# Altium footprint library PcbLib_ICs.PcbLib: 317 footprints (part 10 of 24)
Each footprint in its own frame and in the unit in brackets; x right, y up, seen from the top. Pads: shape width x height; smd on the part's side, far side on the other; paste and mask are expansions set on the pad; w line width, h text height; cw(c..) or ccw(c..) is an arc to the next point about the centre after c.
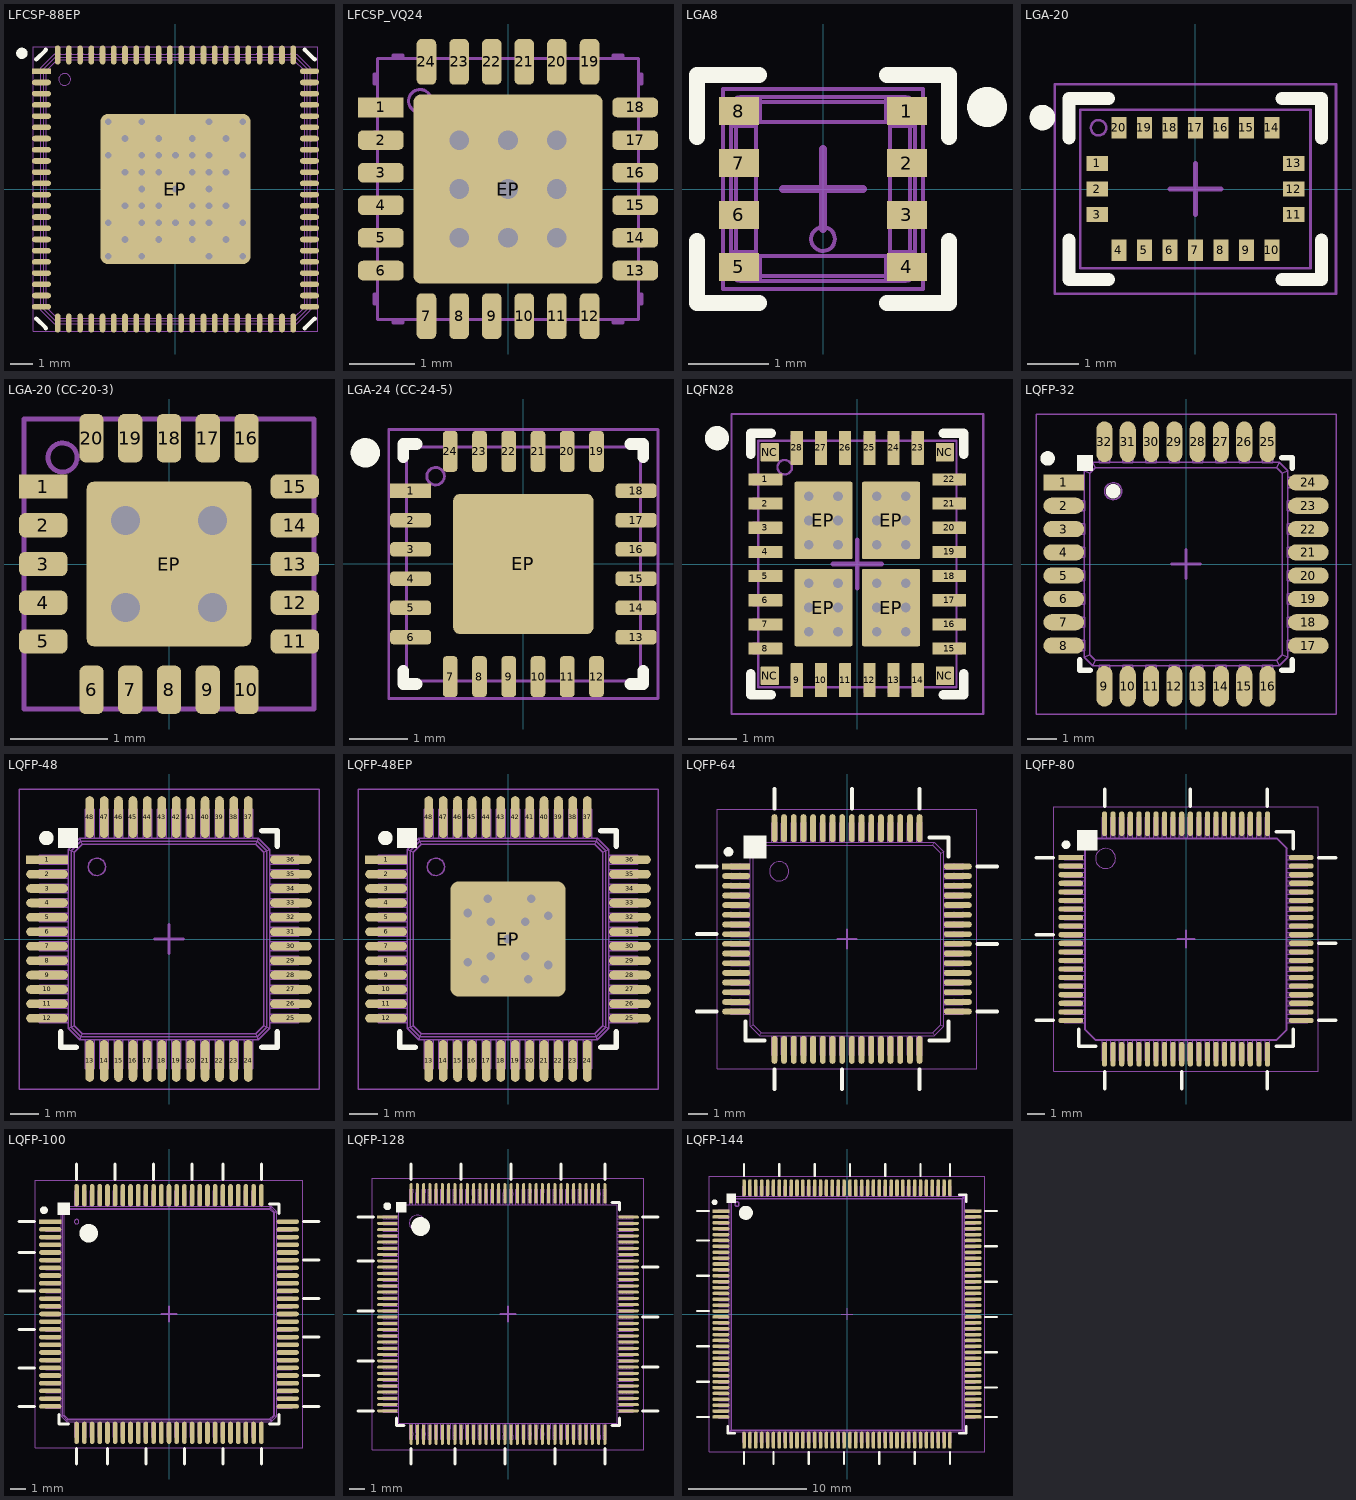
[diagram p9: the footprints below, top view; thin cyan lines are the x and y axes]

## LFCSP-88EP [mm]
pads (89):
  rect 0.85x0.25 smd paste+0 mask+0.08: 1(-5.975,5.25)
  oval 0.85x0.25 smd paste+0 mask+0.08: 2(-5.975,4.75) 3(-5.975,4.25) 4(-5.975,3.75) 5(-5.975,3.25) 6(-5.975,2.75) 7(-5.975,2.25) 8(-5.975,1.75) 9(-5.975,1.25) 10(-5.975,0.75) 11(-5.975,0.25) 12(-5.975,-0.25) 13(-5.975,-0.75) 14(-5.975,-1.25) 15(-5.975,-1.75) 16(-5.975,-2.25) 17(-5.975,-2.75) 18(-5.975,-3.25) 19(-5.975,-3.75) 20(-5.975,-4.25) 21(-5.975,-4.75) 22(-5.975,-5.25) 45(5.975,-5.25) 46(5.975,-4.75) 47(5.975,-4.25) 48(5.975,-3.75) 49(5.975,-3.25) 50(5.975,-2.75) 51(5.975,-2.25) 52(5.975,-1.75) 53(5.975,-1.25) 54(5.975,-0.75) 55(5.975,-0.25) 56(5.975,0.25) 57(5.975,0.75) 58(5.975,1.25) 59(5.975,1.75) 60(5.975,2.25) 61(5.975,2.75) 62(5.975,3.25) 63(5.975,3.75) 64(5.975,4.25) 65(5.975,4.75) 66(5.975,5.25)
  oval 0.25x0.85 smd paste+0 mask+0.08: 23(-5.25,-5.975) 24(-4.75,-5.975) 25(-4.25,-5.975) 26(-3.75,-5.975) 27(-3.25,-5.975) 28(-2.75,-5.975) 29(-2.25,-5.975) 30(-1.75,-5.975) 31(-1.25,-5.975) 32(-0.75,-5.975) 33(-0.25,-5.975) 34(0.25,-5.975) 35(0.75,-5.975) 36(1.25,-5.975) 37(1.75,-5.975) 38(2.25,-5.975) 39(2.75,-5.975) 40(3.25,-5.975) 41(3.75,-5.975) 42(4.25,-5.975) 43(4.75,-5.975) 44(5.25,-5.975) 67(5.25,5.975) 68(4.75,5.975) 69(4.25,5.975) 70(3.75,5.975) 71(3.25,5.975) 72(2.75,5.975) 73(2.25,5.975) 74(1.75,5.975) 75(1.25,5.975) 76(0.75,5.975) 77(0.25,5.975) 78(-0.25,5.975) 79(-0.75,5.975) 80(-1.25,5.975) 81(-1.75,5.975) 82(-2.25,5.975) 83(-2.75,5.975) 84(-3.25,5.975) 85(-3.75,5.975) 86(-4.25,5.975) 87(-4.75,5.975) 88(-5.25,5.975)
  rrect10% 6.7x6.7 smd paste-10 mask+0.08: EP(0,0)
via -3,-1.5 diameter 0.7 hole 0.3
via -3,-3 diameter 0.7 hole 0.3
via -1.5,-3 diameter 0.7 hole 0.3
via 1.5,-3 diameter 0.7 hole 0.3
via 3,-3 diameter 0.7 hole 0.3
via 3,-1.5 diameter 0.7 hole 0.3
via 3,1.5 diameter 0.7 hole 0.3
via 3,3 diameter 0.7 hole 0.3
via 1.5,3 diameter 0.7 hole 0.3
via -3,3 diameter 0.7 hole 0.3
via -3,1.5 diameter 0.7 hole 0.3
via -1.5,3 diameter 0.7 hole 0.3
via -1.5,0.75 diameter 0.7 hole 0.3
via -1.5,-0.75 diameter 0.7 hole 0.3
via -2.25,0.75 diameter 0.7 hole 0.3
via -0.75,2.25 diameter 0.7 hole 0.3
via -2.25,2.25 diameter 0.7 hole 0.3
via -2.25,-0.75 diameter 0.7 hole 0.3
via -0.75,-2.25 diameter 0.7 hole 0.3
via -2.25,-2.25 diameter 0.7 hole 0.3
via -1.5,-1.5 diameter 0.7 hole 0.3
via -0.75,-0.75 diameter 0.7 hole 0.3
via 0.75,-2.25 diameter 0.7 hole 0.3
via 2.25,-0.75 diameter 0.7 hole 0.3
via 2.25,-2.25 diameter 0.7 hole 0.3
via 1.5,-1.5 diameter 0.7 hole 0.3
via 0.75,-0.75 diameter 0.7 hole 0.3
via 2.25,0.75 diameter 0.7 hole 0.3
via 0.75,2.25 diameter 0.7 hole 0.3
via 2.25,2.25 diameter 0.7 hole 0.3
via 1.5,1.5 diameter 0.7 hole 0.3
via 0.75,0.75 diameter 0.7 hole 0.3
via 0,0 diameter 0.7 hole 0.3
via -0.75,-1.5 diameter 0.7 hole 0.3
via 0.75,-1.5 diameter 0.7 hole 0.3
via 1.5,-0.75 diameter 0.7 hole 0.3
via 1.5,0.75 diameter 0.7 hole 0.3
via 0.75,1.5 diameter 0.7 hole 0.3
via -0.75,1.5 diameter 0.7 hole 0.3
via 0,1.5 diameter 0.7 hole 0.3
via -1.5,0 diameter 0.7 hole 0.3
via 0,-1.5 diameter 0.7 hole 0.3
via 1.5,0 diameter 0.7 hole 0.3
via -0.75,0.75 diameter 0.7 hole 0.3
via -1.5,1.5 diameter 0.7 hole 0.3
Top Overlay:
  circle w0.25: c-6.85,6.05 r0.125
  lines w0.2: -6.2,-5.775 -5.775,-6.2 ; -6.2,5.775 -5.775,6.2 ; 5.775,-6.2 6.2,-5.775 ; 5.775,6.2 6.2,5.775
Top Paste:
  region: 3.1,-3.1 3.1,-2.5 2.5,-2.5 2.5,-3.1
  region: 2.3,-3.1 2.3,-2.5 1.7,-2.5 1.7,-3.1
  region: 1.5,-3.1 1.5,-2.5 0.9,-2.5 0.9,-3.1
  region: 0.7,-3.1 0.7,-2.5 0.1,-2.5 0.1,-3.1
  region: -2.5,-3.1 -2.5,-2.5 -3.1,-2.5 -3.1,-3.1
  region: -1.7,-3.1 -1.7,-2.5 -2.3,-2.5 -2.3,-3.1
  region: -0.9,-3.1 -0.9,-2.5 -1.5,-2.5 -1.5,-3.1
  region: -0.1,-3.1 -0.1,-2.5 -0.7,-2.5 -0.7,-3.1
  region: 3.1,-2.3 3.1,-1.7 2.5,-1.7 2.5,-2.3
  region: 2.3,-2.3 2.3,-1.7 1.7,-1.7 1.7,-2.3
  region: 1.5,-2.3 1.5,-1.7 0.9,-1.7 0.9,-2.3
  region: 0.7,-2.3 0.7,-1.7 0.1,-1.7 0.1,-2.3
  region: -2.5,-2.3 -2.5,-1.7 -3.1,-1.7 -3.1,-2.3
  region: -1.7,-2.3 -1.7,-1.7 -2.3,-1.7 -2.3,-2.3
  region: -0.9,-2.3 -0.9,-1.7 -1.5,-1.7 -1.5,-2.3
  region: -0.1,-2.3 -0.1,-1.7 -0.7,-1.7 -0.7,-2.3
  region: 3.1,-1.5 3.1,-0.9 2.5,-0.9 2.5,-1.5
  region: 2.3,-1.5 2.3,-0.9 1.7,-0.9 1.7,-1.5
  region: 1.5,-1.5 1.5,-0.9 0.9,-0.9 0.9,-1.5
  region: 0.7,-1.5 0.7,-0.9 0.1,-0.9 0.1,-1.5
  region: -2.5,-1.5 -2.5,-0.9 -3.1,-0.9 -3.1,-1.5
  region: -1.7,-1.5 -1.7,-0.9 -2.3,-0.9 -2.3,-1.5
  region: -0.9,-1.5 -0.9,-0.9 -1.5,-0.9 -1.5,-1.5
  region: -0.1,-1.5 -0.1,-0.9 -0.7,-0.9 -0.7,-1.5
  region: -3.1,3.1 -3.1,2.5 -2.5,2.5 -2.5,3.1
  region: -2.3,3.1 -2.3,2.5 -1.7,2.5 -1.7,3.1
  region: -1.5,3.1 -1.5,2.5 -0.9,2.5 -0.9,3.1
  region: -0.7,3.1 -0.7,2.5 -0.1,2.5 -0.1,3.1
  region: 2.5,3.1 2.5,2.5 3.1,2.5 3.1,3.1
  region: 1.7,3.1 1.7,2.5 2.3,2.5 2.3,3.1
  region: 0.9,3.1 0.9,2.5 1.5,2.5 1.5,3.1
  region: 0.1,3.1 0.1,2.5 0.7,2.5 0.7,3.1
  region: -3.1,2.3 -3.1,1.7 -2.5,1.7 -2.5,2.3
  region: -3.1,0.7 -3.1,0.1 -2.5,0.1 -2.5,0.7
  region: -3.1,1.5 -3.1,0.9 -2.5,0.9 -2.5,1.5
  region: -2.3,2.3 -2.3,1.7 -1.7,1.7 -1.7,2.3
  region: -2.3,0.7 -2.3,0.1 -1.7,0.1 -1.7,0.7
  region: -2.3,1.5 -2.3,0.9 -1.7,0.9 -1.7,1.5
  region: -1.5,2.3 -1.5,1.7 -0.9,1.7 -0.9,2.3
  region: -1.5,0.7 -1.5,0.1 -0.9,0.1 -0.9,0.7
  region: -1.5,1.5 -1.5,0.9 -0.9,0.9 -0.9,1.5
  region: -0.7,2.3 -0.7,1.7 -0.1,1.7 -0.1,2.3
  region: -0.7,0.7 -0.7,0.1 -0.1,0.1 -0.1,0.7
  region: -0.7,1.5 -0.7,0.9 -0.1,0.9 -0.1,1.5
  region: 2.5,2.3 2.5,1.7 3.1,1.7 3.1,2.3
  region: 2.5,0.7 2.5,0.1 3.1,0.1 3.1,0.7
  region: 2.5,1.5 2.5,0.9 3.1,0.9 3.1,1.5
  region: 1.7,2.3 1.7,1.7 2.3,1.7 2.3,2.3
  region: 1.7,0.7 1.7,0.1 2.3,0.1 2.3,0.7
  region: 1.7,1.5 1.7,0.9 2.3,0.9 2.3,1.5
  region: 0.9,2.3 0.9,1.7 1.5,1.7 1.5,2.3
  region: 0.9,0.7 0.9,0.1 1.5,0.1 1.5,0.7
  region: 0.9,1.5 0.9,0.9 1.5,0.9 1.5,1.5
  region: 0.1,2.3 0.1,1.7 0.7,1.7 0.7,2.3
  region: 0.1,0.7 0.1,0.1 0.7,0.1 0.7,0.7
  region: 0.1,1.5 0.1,0.9 0.7,0.9 0.7,1.5
  region: 3.1,-0.1 2.5,-0.1 2.5,-0.7 3.1,-0.7
  region: 1.5,-0.1 0.9,-0.1 0.9,-0.7 1.5,-0.7
  region: 2.3,-0.1 1.7,-0.1 1.7,-0.7 2.3,-0.7
  rectangle: 0.1,-0.7 0.7,-0.1
  rectangle: -2.3,-0.7 -1.7,-0.1
  rectangle: -3.1,-0.7 -2.5,-0.1
  rectangle: -1.5,-0.7 -0.9,-0.1
  rectangle: -0.7,-0.7 -0.1,-0.1
Bottom Solder:
  region: -3.5,3.5 -0.75,3.5 0,2.75 0.75,3.5 3.5,3.5 3.5,0.75 2.75,0 3.5,-0.75 3.5,-3.5 0.75,-3.5 0,-2.75 -0.75,-3.5 -3.5,-3.5 -3.5,-0.75 -2.75,0 -3.5,0.75
Top Assy:
  drawing of 297 lines, arcs and shapes, not listed
  text ".Designator" at -3.443,-0.467 h2
Top Text:
  lines w0.05: -6.35,-6.35 6.35,-6.35 6.35,6.35 -6.35,6.35 -6.35,-6.35
  lines w0.1: -0.5,0 0.5,0 ; 0,-0.5 0,0.5
3D body "User Library-LFCSP_VQ88(CP-88-5).step": height 0.8, standoff 0, extent -6.01,-6.01 6.05,6.05

## LFCSP_VQ24 [mm] "Case style HCP-24-2"
pads (25):
  rect 0.7x0.3 smd paste+0 mask+0.05: 1(-1.95,1.25)
  rrect50% 0.7x0.3 smd paste+0 mask+0.05: 2(-1.95,0.75) 3(-1.95,0.25) 4(-1.95,-0.25) 5(-1.95,-0.75) 6(-1.95,-1.25) 13(1.95,-1.25) 14(1.95,-0.75) 15(1.95,-0.25) 16(1.95,0.25) 17(1.95,0.75) 18(1.95,1.25)
  rrect50% 0.3x0.7 smd paste+0 mask+0.05: 7(-1.25,-1.95) 8(-0.75,-1.95) 9(-0.25,-1.95) 10(0.25,-1.95) 11(0.75,-1.95) 12(1.25,-1.95) 19(1.25,1.95) 20(0.75,1.95) 21(0.25,1.95) 22(-0.25,1.95) 23(-0.75,1.95) 24(-1.25,1.95)
  rrect8% 2.9x2.9 smd paste-3 mask+0.05: EP(0,0)
via -0.75,0.75 diameter 0.7 hole 0.3
via 0.75,0.75 diameter 0.7 hole 0.3
via 0.75,-0.75 diameter 0.7 hole 0.3
via -0.75,-0.75 diameter 0.7 hole 0.3
via 0,0 diameter 0.7 hole 0.3
via 0,0.75 diameter 0.7 hole 0.3
via 0.75,0 diameter 0.7 hole 0.3
via -0.75,0 diameter 0.7 hole 0.3
via 0,-0.75 diameter 0.7 hole 0.3
Top Paste:
  region: -0.8,-1.3 -0.8,-0.8 -1.3,-0.8 -1.3,-1.3
  rectangle: 0.8,-1.3 1.3,-0.8
  rectangle: 0.1,-1.3 0.6,-0.8
  rectangle: -0.6,-1.3 -0.1,-0.8
  region: -0.8,0.8 -0.8,1.3 -1.3,1.3 -1.3,0.8
  rectangle: 0.8,0.8 1.3,1.3
  rectangle: 0.1,0.8 0.6,1.3
  rectangle: -0.6,0.8 -0.1,1.3
  region: -0.8,0.1 -0.8,0.6 -1.3,0.6 -1.3,0.1
  rectangle: 0.8,0.1 1.3,0.6
  rectangle: 0.1,0.1 0.6,0.6
  rectangle: -0.6,0.1 -0.1,0.6
  region: -0.8,-0.6 -0.8,-0.1 -1.3,-0.1 -1.3,-0.6
  rectangle: 0.8,-0.6 1.3,-0.1
  rectangle: 0.1,-0.6 0.6,-0.1
  rectangle: -0.6,-0.6 -0.1,-0.1
Bottom Solder:
  region: -1.2,1.2 -0.3,1.2 0,0.9 0.3,1.2 1.2,1.2 1.2,0.3 0.9,0 1.2,-0.3 1.2,-1.2 0.3,-1.2 0,-0.9 -0.3,-1.2 -1.2,-1.2 -1.2,-0.3 -0.9,0 -1.2,0.3
Top Assy:
  circle w0.05: c-1.35,1.35 r0.175
  lines w0.05: -2,-1.76 -2.05,-1.76 -2.05,-1.61 -2,-1.61 ; -2,-1.37 -2.05,-1.37 -2.05,-1.13 -2,-1.13 ; -2,-0.87 -2.05,-0.87 -2.05,-0.63 -2,-0.63 ; -2,-0.37 -2.05,-0.37 -2.05,-0.13 -2,-0.13 ; -2,0.13 -2.05,0.13 -2.05,0.37 -2,0.37 ; -2,0.63 -2.05,0.63 -2.05,0.87 -2,0.87 ; -2,1.13 -2.05,1.13 -2.05,1.37 -2,1.37 ; -2,1.61 -2.05,1.61 -2.05,1.76 -2,1.76 ; -1.76,-2 -1.76,-2.05 -1.61,-2.05 -1.61,-2 ; -1.76,2 -1.76,2.05 -1.61,2.05 -1.61,2 ; -1.37,-2 -1.37,-2.05 -1.13,-2.05 -1.13,-2 ; -1.37,2 -1.37,2.05 -1.13,2.05 -1.13,2 ; -0.87,-2 -0.87,-2.05 -0.63,-2.05 -0.63,-2 ; -0.87,2 -0.87,2.05 -0.63,2.05 -0.63,2 ; -0.37,-2 -0.37,-2.05 -0.13,-2.05 -0.13,-2 ; -0.37,2 -0.37,2.05 -0.13,2.05 -0.13,2 ; 0.13,-2 0.13,-2.05 0.37,-2.05 0.37,-2 ; 0.13,2 0.13,2.05 0.37,2.05 0.37,2 ; 0.63,-2 0.63,-2.05 0.87,-2.05 0.87,-2 ; 0.63,2 0.63,2.05 0.87,2.05 0.87,2 ; 1.13,-2 1.13,-2.05 1.37,-2.05 1.37,-2 ; 1.13,2 1.13,2.05 1.37,2.05 1.37,2 ; 1.61,-2 1.61,-2.05 1.76,-2.05 1.76,-2 ; 1.61,2 1.61,2.05 1.76,2.05 1.76,2 ; 2,-1.76 2.05,-1.76 2.05,-1.61 2,-1.61 ; 2,-1.37 2.05,-1.37 2.05,-1.13 2,-1.13 ; 2,-0.87 2.05,-0.87 2.05,-0.63 2,-0.63 ; 2,-0.37 2.05,-0.37 2.05,-0.13 2,-0.13 ; 2,0.13 2.05,0.13 2.05,0.37 2,0.37 ; 2,0.63 2.05,0.63 2.05,0.87 2,0.87 ; 2,1.13 2.05,1.13 2.05,1.37 2,1.37 ; 2,1.61 2.05,1.61 2.05,1.76 2,1.76 ; -2,-2 2,-2 2,2 -2,2 -2,-2
  text ".Designator" at -2.579,-0.349 h1.5
Top Text:
  lines w0.1: -0.5,0 0.5,0 ; 0,-0.5 0,0.5
3D body "LFCSP_VQ24.SLDPRT": height 1.05, standoff 0, extent -2.05,-2.05 2.05,2.05

## LGA8 [mm] "LGA-8 2.5 x 2.5mm"
pads (8):
  rect 0.5x0.35 smd paste+0 mask+0.08: 1(1.05,0.975) 2(1.05,0.325) 3(1.05,-0.325) 4(1.05,-0.975) 5(-1.05,-0.975) 6(-1.05,-0.325) 7(-1.05,0.325) 8(-1.05,0.975)
Top Overlay:
  circle w0.25: c2.05,1.025 r0.125
  lines w0.2: -1.575,-0.65 -1.575,-1.425 -0.8,-1.425 ; -1.575,0.65 -1.575,1.425 -0.8,1.425 ; 0.8,-1.425 1.575,-1.425 1.575,-0.65 ; 0.8,1.425 1.575,1.425 1.575,0.65
Top Assy:
  circle w0.05: c0,-0.625 r0.149
  lines w0.05: -1.047,-0.945 -1.149,-1.007 ; -1.047,0.945 -1.149,1.007 ; -0.947,-1.045 -1.01,-1.148 ; -0.947,1.045 -1.01,1.148 ; 0.947,-1.045 1.01,-1.148 ; 0.947,1.045 1.01,1.148 ; 1.047,-0.945 1.149,-1.007 ; 1.047,0.945 1.149,1.007 ; -1.149,-1.007 ccw(c-0.79,-0.79) -1.01,-1.148 ; -1.149,-1.007 -1.149,-1.028 ccw(c-1.029,-1.028) -1.029,-1.148 -1.01,-1.148 ; -1.149,-1.007 -1.149,-0.79 ; -1.149,-0.79 -1.09,-0.79 ; -1.149,-0.79 -1.149,0.79 ; -1.149,0.79 -1.09,0.79 ; -1.149,0.79 -1.149,1.007 ; -1.149,1.007 cw(c-0.79,0.79) -1.01,1.148 ; -1.149,1.007 -1.149,1.028 cw(c-1.029,1.028) -1.029,1.148 -1.01,1.148 ; -1.09,-0.79 ccw(c-0.79,-0.79) -0.79,-1.09 ; -1.09,-0.79 -0.84,-0.79 ; -1.09,-0.79 -1.09,0.79 ; -1.09,0.79 cw(c-0.79,0.79) -0.79,1.09 ; -1.09,0.79 -0.84,0.79 ; -1.01,-1.148 -0.79,-1.148 ; -1.01,1.148 -0.79,1.148 ; -0.84,-0.79 ccw(c-0.79,-0.79) -0.79,-0.84 ; -0.84,-0.79 -0.84,0.79 ; -0.84,0.79 cw(c-0.79,0.79) -0.79,0.84 ; -0.79,-1.148 -0.79,-1.09 ; -0.79,-1.148 0.79,-1.148 ; -0.79,-1.09 -0.79,-0.84 ; -0.79,-1.09 0.79,-1.09 ; -0.79,-0.84 0.79,-0.84 ; -0.79,0.84 -0.79,1.09 ; -0.79,0.84 0.79,0.84 ; -0.79,1.09 -0.79,1.148 ; -0.79,1.09 0.79,1.09 ; -0.79,1.148 0.79,1.148 ; 0.79,-1.148 0.79,-1.09 ; 0.79,-1.148 1.01,-1.148 ; 0.79,-1.09 ccw(c0.79,-0.79) 1.09,-0.79 ; 0.79,-1.09 0.79,-0.84 ; 0.79,-0.84 ccw(c0.79,-0.79) 0.84,-0.79 ; 0.79,0.84 cw(c0.79,0.79) 0.84,0.79 ; 0.79,0.84 0.79,1.09 ; 0.79,1.09 cw(c0.79,0.79) 1.09,0.79 ; 0.79,1.09 0.79,1.148 ; 0.79,1.148 1.01,1.148 ; 0.84,-0.79 0.84,0.79 ; 0.84,-0.79 1.09,-0.79 ; 0.84,0.79 1.09,0.79 ; 1.01,-1.148 ccw(c0.79,-0.79) 1.149,-1.007 ; 1.01,-1.148 1.029,-1.148 ccw(c1.029,-1.028) 1.149,-1.028 1.149,-1.007 ; 1.01,1.148 cw(c0.79,0.79) 1.149,1.007 ; 1.01,1.148 1.029,1.148 cw(c1.029,1.028) 1.149,1.028 1.149,1.007 ; 1.09,-0.79 1.149,-0.79 ; 1.09,-0.79 1.09,0.79 ; 1.09,0.79 1.149,0.79 ; 1.149,-1.007 1.149,-0.79 ; 1.149,-0.79 1.149,0.79 ; 1.149,0.79 1.149,1.007 ; -1.25,-1.25 1.25,-1.25 1.25,1.25 -1.25,1.25 -1.25,-1.25
  text ".Designator" at -2.554,-0.349 h1.5
Top Text:
  lines w0.1: -0.5,0 0.5,0 ; 0,-0.5 0,0.5
3D body "Bosch_BME280.STEP": height 0.93, standoff 0, extent -1.25,-1.25 1.25,1.25

## LGA-20 [mm] "LGA-20, 20-Leads, Body 4,50x3,00mm, Pitch 0,50mm"
height 1
pads (20):
  rect 0.425x0.3 smd paste+0 mask+0.05: 1(-1.925,0.5) 2(-1.925,0) 3(-1.925,-0.5) 11(1.925,-0.5) 12(1.925,0) 13(1.925,0.5)
  rect 0.3x0.425 smd paste+0 mask+0.05: 4(-1.5,-1.2) 5(-1,-1.2) 6(-0.5,-1.2) 7(0,-1.2) 8(0.5,-1.2) 9(1,-1.2) 10(1.5,-1.2) 14(1.5,1.2) 15(1,1.2) 16(0.5,1.2) 17(0,1.2) 18(-0.5,1.2) 19(-1,1.2) 20(-1.5,1.2)
Top Overlay:
  circle w0.25: c-3,1.4 r0.125
  lines w0.254: -2.475,-1 -2.475,-1.775 -1.7,-1.775 ; -2.475,1 -2.475,1.775 -1.7,1.775 ; 1.7,-1.775 2.475,-1.775 2.475,-1 ; 1.7,1.775 2.475,1.775 2.475,1
Top Assy:
  circle w0.05: c-1.9,1.2 r0.15
  lines w0.05: -2.255,-1.55 -2.255,1.55 2.255,1.55 2.255,-1.55 -2.255,-1.55
  text ".Designator" at -2.579,-0.349 h1.5
Top Text:
  lines w0.05: -2.755,-2.05 -2.755,2.05 2.755,2.05 2.755,-2.05 -2.755,-2.05
  lines w0.1: -0.5,0 0.5,0 ; 0,-0.5 0,0.5
3D body "LGA-20.step": height 1, standoff 0, extent -2.255,-1.55 2.255,1.55

## LGA-20 (CC-20-3) [mm] "Case style CC-20-3"
pads (21):
  rect 0.5x0.25 smd paste+0 mask+0.05: 1(-1.3,0.8)
  rrect50% 0.5x0.25 smd paste+0 mask+0.05: 2(-1.3,0.4) 3(-1.3,0) 4(-1.3,-0.4) 5(-1.3,-0.8) 11(1.3,-0.8) 12(1.3,-0.4) 13(1.3,0) 14(1.3,0.4) 15(1.3,0.8)
  rrect50% 0.25x0.5 smd paste+0 mask+0.05: 6(-0.8,-1.3) 7(-0.4,-1.3) 8(0,-1.3) 9(0.4,-1.3) 10(0.8,-1.3) 16(0.8,1.3) 17(0.4,1.3) 18(0,1.3) 19(-0.4,1.3) 20(-0.8,1.3)
  rrect8% 1.7x1.7 smd paste-3 mask+0.05: EP(0,0)
via 0.45,0.45 diameter 0.7 hole 0.3
via 0.45,-0.45 diameter 0.7 hole 0.3
via -0.45,0.45 diameter 0.7 hole 0.3
via -0.45,-0.45 diameter 0.7 hole 0.3
Top Paste:
  region: -0.4,-0.4 -0.8,-0.4 -0.8,-0.8 -0.4,-0.8
  rectangle: 0.4,-0.8 0.8,-0.4
  rectangle: -0.2,-0.8 0.2,-0.4
  region: -0.4,0.8 -0.8,0.8 -0.8,0.4 -0.4,0.4
  rectangle: 0.4,0.4 0.8,0.8
  rectangle: -0.2,0.4 0.2,0.8
  region: -0.4,0.2 -0.8,0.2 -0.8,-0.2 -0.4,-0.2
  rectangle: 0.4,-0.2 0.8,0.2
  rectangle: -0.2,-0.2 0.2,0.2
Bottom Solder:
  region: -0.9,0.9 -0.2,0.9 0,0.7 0.2,0.9 0.9,0.9 0.9,0.2 0.7,0 0.9,-0.201 0.9,-0.9 0.199,-0.9 0,-0.7 -0.2,-0.9 -0.9,-0.9 -0.9,-0.2 -0.7,0 -0.9,0.2
Top Assy:
  circle w0.05: c-1.1,1.1 r0.15
  lines w0.05: -1.5,-1.5 1.5,-1.5 1.5,1.5 -1.5,1.5 -1.5,-1.5
  text ".Designator" at -2.579,-0.349 h1.5
Top Text:
  lines w0.1: -0.5,0 0.5,0 ; 0,-0.5 0,0.5
3D body "LGA-20 (CC-20-3).STEP": height 0.73, standoff -0.01, extent -1.5,-1.5 1.5,1.5

## LGA-24 (CC-24-5) [mm] "PQFN, 24-Leads, Body 4,00x4,00mm, Pitch 0,50mm, Thermal Pad 2,40x2,40mm, IPC Medium Density"
height 1
pads (25):
  rect 0.7x0.25 smd mask+0.06: 1(-1.925,1.25)
  rrect50% 0.7x0.25 smd mask+0.06: 2(-1.925,0.75) 3(-1.925,0.25) 4(-1.925,-0.25) 5(-1.925,-0.75) 6(-1.925,-1.25) 13(1.925,-1.25) 14(1.925,-0.75) 15(1.925,-0.25) 16(1.925,0.25) 17(1.925,0.75) 18(1.925,1.25)
  rrect50% 0.25x0.7 smd mask+0.06: 7(-1.25,-1.925) 8(-0.75,-1.925) 9(-0.25,-1.925) 10(0.25,-1.925) 11(0.75,-1.925) 12(1.25,-1.925) 19(1.25,1.925) 20(0.75,1.925) 21(0.25,1.925) 22(-0.25,1.925) 23(-0.75,1.925) 24(-1.25,1.925)
  rrect10% 2.4x2.4 smd paste-5 mask+0.05: EP(0,0)
Top Overlay:
  circle w0.25: c-2.7,1.9 r0.125
  lines w0.2: -2.05,-1.825 -2.05,-2.05 -1.825,-2.05 ; -2.05,1.825 -2.05,2.05 -1.825,2.05 ; 1.825,-2.05 2.05,-2.05 2.05,-1.825 ; 1.825,2.05 2.05,2.05 2.05,1.825
Top Paste:
  region: -0.7,-0.1 -1.1,-0.1 -1.1,-0.5 -0.7,-0.5
  rectangle: 0.1,-0.5 0.5,-0.1
  rectangle: -0.5,-0.5 -0.1,-0.1
  region: -0.7,1.1 -1.1,1.1 -1.1,0.7 -0.7,0.7
  rectangle: 0.1,0.7 0.5,1.1
  rectangle: -0.5,0.7 -0.1,1.1
  region: -0.7,0.5 -1.1,0.5 -1.1,0.1 -0.7,0.1
  rectangle: 0.1,0.1 0.5,0.5
  rectangle: -0.5,0.1 -0.1,0.5
  rectangle: 0.7,-0.5 1.1,-0.1
  rectangle: 0.7,0.7 1.1,1.1
  rectangle: 0.7,0.1 1.1,0.5
  region: -0.7,-0.7 -1.1,-0.7 -1.1,-1.1 -0.7,-1.1
  rectangle: 0.1,-1.1 0.5,-0.7
  rectangle: -0.5,-1.1 -0.1,-0.7
  rectangle: 0.7,-1.1 1.1,-0.7
Top Assy:
  circle w0.05: c-1.5,1.5 r0.15
  lines w0.05: -2,-2 2,-2 2,2 -2,2 -2,-2
  text ".Designator" at -3.443,-0.467 h2
Top Text:
  lines w0.05: -2.3,-2.3 -2.3,2.3 2.3,2.3 2.3,-2.3 -2.3,-2.3
  lines w0.1: -0.5,0 0.5,0 ; 0,-0.5 0,0.5
3D body "LGA-24(CC-24-5).STEP": height 0.8, standoff 0, extent -2,-2 2,2

## LQFN28 [mm] "QFN-28 package 4x5 mm from Linear Technology devices"
height 0.74
pads (36):
  rrect5% 0.7x0.25 smd paste+0 mask+0.075: 1(-1.9,1.75) 2(-1.9,1.25) 3(-1.9,0.75) 4(-1.9,0.25) 5(-1.9,-0.25) 6(-1.9,-0.75) 7(-1.9,-1.25) 8(-1.9,-1.75) 15(1.9,-1.75) 16(1.9,-1.25) 17(1.9,-0.75) 18(1.9,-0.25) 19(1.9,0.25) 20(1.9,0.75) 21(1.9,1.25) 22(1.9,1.75)
  rrect5% 0.25x0.7 smd paste+0 mask+0.075: 9(-1.25,-2.4) 10(-0.75,-2.4) 11(-0.25,-2.4) 12(0.25,-2.4) 13(0.75,-2.4) 14(1.25,-2.4) 23(1.25,2.4) 24(0.75,2.4) 25(0.25,2.4) 26(-0.25,2.4) 27(-0.75,2.4) 28(-1.25,2.4)
  rrect5% 1.2x1.6 smd paste-50 mask+0.075: EP(-0.7,-0.9) EP(-0.7,0.9) EP(0.7,-0.9) EP(0.7,0.9)
  rrect5% 0.375x0.375 smd paste+0 mask+0.075: NC(-1.81,-2.31) NC(-1.81,2.31) NC(1.81,-2.31) NC(1.81,2.31)
via -0.4,-0.4 diameter 0.5 hole 0.2
via -1,-0.4 diameter 0.5 hole 0.2
via -0.4,-0.9 diameter 0.5 hole 0.2
via -0.4,-1.4 diameter 0.5 hole 0.2
via -1,-0.9 diameter 0.5 hole 0.2
via -1,-1.4 diameter 0.5 hole 0.2
via 0.4,0.4 diameter 0.5 hole 0.2
via 1,0.4 diameter 0.5 hole 0.2
via 0.4,0.9 diameter 0.5 hole 0.2
via 0.4,1.4 diameter 0.5 hole 0.2
via 1,0.9 diameter 0.5 hole 0.2
via 1,1.4 diameter 0.5 hole 0.2
via -0.4,0.4 diameter 0.5 hole 0.2
via -1,0.4 diameter 0.5 hole 0.2
via -0.4,0.9 diameter 0.5 hole 0.2
via -0.4,1.4 diameter 0.5 hole 0.2
via -1,0.9 diameter 0.5 hole 0.2
via -1,1.4 diameter 0.5 hole 0.2
via 1,-1.4 diameter 0.5 hole 0.2
via 1,-0.9 diameter 0.5 hole 0.2
via 0.4,-1.4 diameter 0.5 hole 0.2
via 0.4,-0.9 diameter 0.5 hole 0.2
via 1,-0.4 diameter 0.5 hole 0.2
via 0.4,-0.4 diameter 0.5 hole 0.2
Top Overlay:
  circle w0.25: c-2.9,2.6 r0.125
  lines w0.2: -2.2,-2.275 -2.2,-2.7 -1.775,-2.7 ; -2.2,2.275 -2.2,2.7 -1.775,2.7 ; 1.775,-2.7 2.2,-2.7 2.2,-2.275 ; 1.775,2.7 2.2,2.7 2.2,2.275
Top Paste:
  rectangle: -1.3,-1.7 -0.8,-1
  rectangle: -0.6,-1.7 -0.1,-1
  region: -0.6,-0.1 -0.6,-0.8 -0.1,-0.8 -0.1,-0.1
  region: -1.3,-0.1 -1.3,-0.8 -0.8,-0.8 -0.8,-0.1
  region: 1.3,-1 0.8,-1 0.8,-1.7 1.3,-1.7
  region: 0.6,-1 0.1,-1 0.1,-1.7 0.6,-1.7
  region: 0.1,-0.1 0.1,-0.8 0.6,-0.8 0.6,-0.1
  region: 0.8,-0.1 0.8,-0.8 1.3,-0.8 1.3,-0.1
  region: 1.3,1.7 0.8,1.7 0.8,1 1.3,1
  region: 0.6,1.7 0.1,1.7 0.1,1 0.6,1
  region: 0.6,0.1 0.6,0.8 0.1,0.8 0.1,0.1
  region: 1.3,0.1 1.3,0.8 0.8,0.8 0.8,0.1
  rectangle: -1.3,1 -0.8,1.7
  rectangle: -0.6,1 -0.1,1.7
  region: -0.1,0.1 -0.1,0.8 -0.6,0.8 -0.6,0.1
  region: -0.8,0.1 -0.8,0.8 -1.3,0.8 -1.3,0.1
Bottom Solder:
  region: -1.6,2 -0.2,2 0,1.8 0.2,2 1.6,2 1.6,0.3 1.3,0 1.6,-0.3 1.6,-2 0.2,-2 0,-1.8 -0.2,-2 -1.6,-2 -1.6,-0.3 -1.3,0 -1.6,0.3
Top Assy:
  circle w0.05: c-1.5,2 r0.15
  lines w0.05: -2.05,-1.85 -2.15,-1.85 -2.15,-1.65 -2.05,-1.65 ; -2.05,-1.35 -2.15,-1.35 -2.15,-1.15 -2.05,-1.15 ; -2.05,-0.85 -2.15,-0.85 -2.15,-0.65 -2.05,-0.65 ; -2.05,-0.35 -2.15,-0.35 -2.15,-0.15 -2.05,-0.15 ; -2.05,0.15 -2.15,0.15 -2.15,0.35 -2.05,0.35 ; -2.05,0.65 -2.15,0.65 -2.15,0.85 -2.05,0.85 ; -2.05,1.15 -2.15,1.15 -2.15,1.35 -2.05,1.35 ; -2.05,1.65 -2.15,1.65 -2.15,1.85 -2.05,1.85 ; -1.35,-2.55 -1.35,-2.65 -1.15,-2.65 -1.15,-2.55 ; -1.35,2.55 -1.35,2.65 -1.15,2.65 -1.15,2.55 ; -0.85,-2.55 -0.85,-2.65 -0.65,-2.65 -0.65,-2.55 ; -0.85,2.55 -0.85,2.65 -0.65,2.65 -0.65,2.55 ; -0.35,-2.55 -0.35,-2.65 -0.15,-2.65 -0.15,-2.55 ; -0.35,2.55 -0.35,2.65 -0.15,2.65 -0.15,2.55 ; 0.15,-2.55 0.15,-2.65 0.35,-2.65 0.35,-2.55 ; 0.15,2.55 0.15,2.65 0.35,2.65 0.35,2.55 ; 0.65,-2.55 0.65,-2.65 0.85,-2.65 0.85,-2.55 ; 0.65,2.55 0.65,2.65 0.85,2.65 0.85,2.55 ; 1.15,-2.55 1.15,-2.65 1.35,-2.65 1.35,-2.55 ; 1.15,2.55 1.15,2.65 1.35,2.65 1.35,2.55 ; 2.05,-1.85 2.15,-1.85 2.15,-1.65 2.05,-1.65 ; 2.05,-1.35 2.15,-1.35 2.15,-1.15 2.05,-1.15 ; 2.05,-0.85 2.15,-0.85 2.15,-0.65 2.05,-0.65 ; 2.05,-0.35 2.15,-0.35 2.15,-0.15 2.05,-0.15 ; 2.05,0.15 2.15,0.15 2.15,0.35 2.05,0.35 ; 2.05,0.65 2.15,0.65 2.15,0.85 2.05,0.85 ; 2.05,1.15 2.15,1.15 2.15,1.35 2.05,1.35 ; 2.05,1.65 2.15,1.65 2.15,1.85 2.05,1.85 ; -2.05,-2.55 -2.05,2.55 2.05,2.55 2.05,-2.55 -2.05,-2.55
  text ".Designator" at -2.579,-0.349 h1.5
Top Text: